# Altium footprint library GCT_USB-C.PcbLib: 27 footprints (part 1 of 2)
Each footprint in its own frame and in the unit in brackets; x right, y up, seen from the top. Pads: shape width x height; smd on the part's side, far side on the other; paste and mask are expansions set on the pad; w line width, h text height; cw(c..) or ccw(c..) is an arc to the next point about the centre after c.
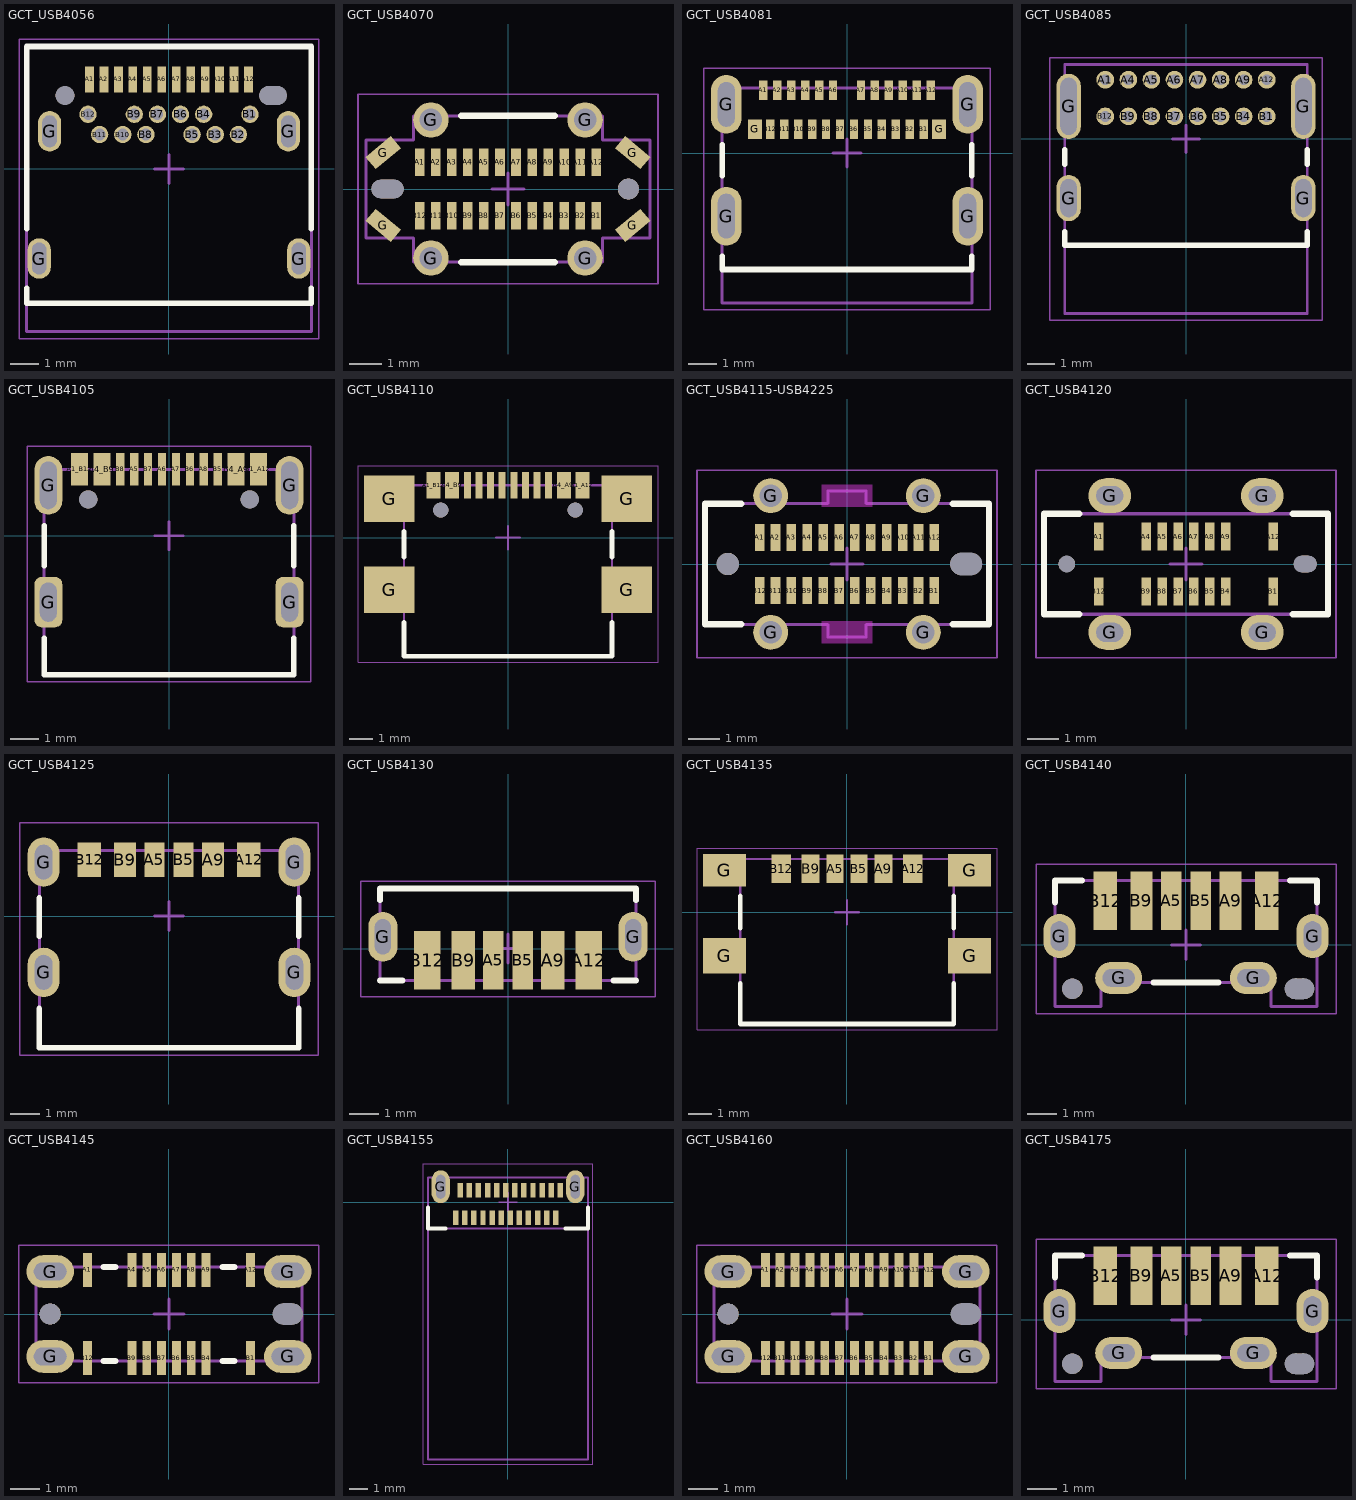
[diagram p0: the footprints below, top view; thin cyan lines are the x and y axes]

## GCT_USB4056 [mm]
height 3.31
pads (30):
  rect 0.3x0.9 smd mask+0.07: A1(-2.75,3.1) A2(-2.25,3.1) A3(-1.75,3.1) A4(-1.25,3.1) A5(-0.75,3.1) A6(-0.25,3.1) A7(0.25,3.1) A8(0.75,3.1) A9(1.25,3.1) A10(1.75,3.1) A11(2.25,3.1) A12(2.75,3.1)
  round 0.6 hole 0.4 mask+0.07: B1(2.8,1.89) B2(2.4,1.19) B3(1.6,1.19) B4(1.2,1.89) B5(0.8,1.19) B6(0.4,1.89) B7(-0.4,1.89) B8(-0.8,1.19) B9(-1.2,1.89) B10(-1.6,1.19) B11(-2.4,1.19) B12(-2.8,1.89)
  oval 0.8x1.4 hole 0.5 slot 1.1 at 90 deg mask+0.07: G(-4.49,-3.1) G(-4.13,1.3) G(4.13,1.3) G(4.49,-3.1)
  round 0.65 hole 0.65 unplated mask+0.07: ""(-3.6,2.54)
  oval 0.95x0.65 hole 0.65 slot 0.95 at 0 deg unplated mask+0.07: ""(3.6,2.54)
Top Overlay:
  lines w0.2: -4.925,-4.13 -4.925,-4.65 4.925,-4.65 4.925,-4.13 ; -4.925,-2.07 -4.925,4.24 4.925,4.24 4.925,-2.07
Top Assembly:
  lines w0.1: -4.925,-4.65 -4.925,4.24 4.925,4.24 4.925,-4.65 -4.925,-4.65
  text ".Designator" at -2.252,-0.226 h1
Top Courtyard:
  lines w0.05: -5.175,-5.88 -5.175,4.49 5.175,4.49 5.175,-5.88 -5.175,-5.88
  lines w0.1: -0.5,0 0.5,0 ; 0,-0.5 0,0.5
Assembly Notes:
  lines w0.1: -4.925,-5.63 4.925,-5.63 4.925,-4.65 -4.925,-4.65 -4.925,-5.63
  text "PCB Edge" at 2.716,-4.468 h0.51
3D body "USB4056-03-A--3DModel-STEP-269445.STEP": height 3.31, standoff -1.15, extent -4.925,-5.629 4.925,4.241

## GCT_USB4070 [mm]
height 10.8
pads (34):
  rect 0.3x0.85 smd mask+0.07: A1(-2.75,0.83) A2(-2.25,0.83) A3(-1.75,0.83) A4(-1.25,0.83) A5(-0.75,0.83) A6(-0.25,0.83) A7(0.25,0.83) A8(0.75,0.83) A9(1.25,0.83) A10(1.75,0.83) A11(2.25,0.83) A12(2.75,0.83) B1(2.75,-0.83) B2(2.25,-0.83) B3(1.75,-0.83) B4(1.25,-0.83) B5(0.75,-0.83) B6(0.25,-0.83) B7(-0.25,-0.83) B8(-0.75,-0.83) B9(-1.25,-0.83) B10(-1.75,-0.83) B11(-2.25,-0.83) B12(-2.75,-0.83)
  rect 1.03x0.5 smd rot 140 mask+0.07: G(-3.88,-1.135) G(3.88,1.135)
  rect 1.03x0.5 smd rot 40 mask+0.07: G(-3.88,1.135) G(3.88,-1.135)
  round 1.1 hole 0.7 mask+0.07: G(-2.4,-2.15) G(-2.4,2.15) G(2.4,-2.15) G(2.4,2.15)
  oval 1x0.58 hole 0.58 slot 1 at 0 deg unplated mask+0.07: ""(-3.75,0)
  round 0.66 hole 0.66 unplated mask+0.07: ""(3.75,0)
Top Overlay:
  lines w0.2: -1.456,-2.275 1.456,-2.275 ; -1.456,2.275 1.456,2.275
Top Assembly:
  lines w0.1: -4.42,-1.53 -4.42,1.53 -2.94,1.53 -2.94,2.275 2.94,2.275 2.94,1.53 4.42,1.53 4.42,-1.53 2.94,-1.53 2.94,-2.275 -2.94,-2.275 -2.94,-1.53 -4.42,-1.53
  text ".Designator" at -2.252,-0.226 h1
Top Courtyard:
  lines w0.05: -4.67,-2.95 4.67,-2.95 4.67,2.95 -4.67,2.95 -4.67,-2.95
  lines w0.1: -0.5,0 0.5,0 ; 0,-0.5 0,0.5
3D body "step_temp.STEP": height 10.8, standoff -1.3, extent -4.42,-2.275 4.42,2.275

## GCT_USB4081 [mm]
height 3.26
pads (30):
  rect 0.3x0.7 smd mask+0.07: A1(-3,2.255) A2(-2.5,2.255) A3(-2,2.255) A4(-1.5,2.255) A5(-1,2.255) A6(-0.5,2.255) A7(0.5,2.255) A8(1,2.255) A9(1.5,2.255) A10(2,2.255) A11(2.5,2.255) A12(3,2.255) B1(2.75,0.855) B2(2.25,0.855) B3(1.75,0.855) B4(1.25,0.855) B5(0.75,0.855) B6(0.25,0.855) B7(-0.25,0.855) B8(-0.75,0.855) B9(-1.25,0.855) B10(-1.75,0.855) B11(-2.25,0.855) B12(-2.75,0.855)
  oval 1.1x2.1 hole 0.6 slot 1.6 at 90 deg mask+0.07: G(-4.32,-2.255) G(-4.32,1.745) G(4.32,-2.255) G(4.32,1.745)
  rect 0.5x0.7 smd mask+0.07: G(-3.3,0.855) G(3.3,0.855)
Top Overlay:
  lines w0.2: -4.47,-3.697 -4.47,-4.167 4.47,-4.167 4.47,-3.697 ; -4.47,-0.813 -4.47,0.303 ; 4.47,-0.813 4.47,0.303
Top Assembly:
  lines w0.1: -4.47,-4.167 4.47,-4.167 4.47,2.335 -4.47,2.335 -4.47,-4.167
  text ".Designator" at -2.252,-0.226 h1
Top Courtyard:
  lines w0.05: -5.12,-5.615 5.12,-5.615 5.12,3.045 -5.12,3.045 -5.12,-5.615
  lines w0.1: -0.5,0 0.5,0 ; 0,-0.5 0,0.5
Assembly Notes:
  lines w0.1: -4.47,-5.365 -4.47,-4.167 4.47,-4.167 4.47,-5.365 -4.47,-5.365
  text "PCB Edge" at 2.266,-3.973 h0.51
3D body "usb4081-03-a.stp": height 3.26, standoff -1.6, extent -4.47,-5.4 4.47,2.405

## GCT_USB4085 [mm]
height 3.16
pads (20):
  round 0.65 hole 0.4 mask+0.07: A1(-2.975,2.18) A4(-2.125,2.18) A5(-1.275,2.18) A6(-0.425,2.18) A7(0.425,2.18) A8(1.275,2.18) A9(2.125,2.18) A12(2.975,2.18) B1(2.975,0.83) B4(2.125,0.83) B5(1.275,0.83) B6(0.425,0.83) B7(-0.425,0.83) B8(-1.275,0.83) B9(-2.125,0.83) B12(-2.975,0.83)
  oval 0.9x1.7 hole 0.6 slot 1.4 at 90 deg mask+0.07: G(-4.325,-2.18) G(4.325,-2.18)
  oval 0.9x2.4 hole 0.6 slot 2.1 at 90 deg mask+0.07: G(-4.325,1.2) G(4.325,1.2)
Top Overlay:
  lines w0.2: -4.47,-3.422 -4.47,-3.92 4.47,-3.92 4.47,-3.422 ; -4.47,-0.938 -4.47,-0.392 ; 4.47,-0.938 4.47,-0.392
Top Assembly:
  lines w0.1: -4.47,-3.92 4.47,-3.92 4.47,2.74 -4.47,2.74 -4.47,-3.92
  text ".Designator" at -2.252,-0.226 h1
Top Courtyard:
  lines w0.05: -5.025,-6.68 5.025,-6.68 5.025,2.99 -5.025,2.99 -5.025,-6.68
  lines w0.1: -0.5,0 0.5,0 ; 0,-0.5 0,0.5
Assembly Notes:
  lines w0.1: -4.47,-6.43 4.47,-6.43 4.47,-3.92 -4.47,-3.92 -4.47,-6.43
  text "PCB Edge" at 2.268,-3.695 h0.51
3D body "step_temp.STEP": height 3.46, standoff -2.1, extent -4.47,-6.43 4.47,2.74

## GCT_USB4105 [mm]
height 3.31
pads (18):
  rect 0.6x1.15 smd mask+0.07: A1_B12(-3.2,2.378) A4_B9(-2.4,2.378) B1_A12(3.2,2.378) B4_A9(2.4,2.378)
  rect 0.3x1.15 smd mask+0.07: A5(-1.25,2.378) A6(-0.25,2.378) A7(0.25,2.378) A8(1.25,2.378) B5(1.75,2.378) B6(0.75,2.378) B7(-0.75,2.378) B8(-1.75,2.378)
  rrect50% 1x1.8 hole 0.6 slot 1.4 at 90 deg mask+0.07: G(-4.32,-2.377) G(4.32,-2.377)
  oval 1x2.1 hole 0.6 slot 1.7 at 90 deg mask+0.07: G(-4.32,1.803) G(4.32,1.803)
  round 0.65 hole 0.65 unplated mask+0.07: ""(-2.89,1.303) ""(2.89,1.303)
Top Overlay:
  lines w0.2: -4.47,-3.677 -4.47,-4.977 4.47,-4.977 4.47,-3.677 ; -4.47,-1.077 -4.47,0.361 ; 4.47,-1.077 4.47,0.361
Top Assembly:
  lines w0.1: -4.47,-4.977 -4.47,2.373 4.47,2.373 4.47,-4.977 -4.47,-4.977
  text ".Designator" at -2.252,-0.226 h1
  text "PCB Edge" at 2.268,-4.781 h0.51
Top Courtyard:
  lines w0.05: -5.07,-5.227 5.07,-5.227 5.07,3.203 -5.07,3.203 -5.07,-5.227
  lines w0.1: -0.5,0 0.5,0 ; 0,-0.5 0,0.5
3D body "step_temp.STEP": height 3.31, standoff -1.1, extent -4.47,-4.977 4.47,2.733

## GCT_USB4110 [mm]
height 3.16
pads (18):
  rect 0.6x1.15 smd mask+0.07: A1_B12(-3.2,2.253) A4_B9(-2.4,2.253) B1_A12(3.2,2.253) B4_A9(2.4,2.253)
  rect 0.3x1.15 smd mask+0.07: A5(-1.25,2.253) A6(-0.25,2.253) A7(0.25,2.253) A8(1.25,2.253) B5(1.75,2.253) B6(0.75,2.253) B7(-0.75,2.253) B8(-1.75,2.253)
  rect 2.18x2 smd mask+0.07: G(-5.11,-2.252) G(-5.11,1.678) G(5.11,-2.252) G(5.11,1.678)
  round 0.65 hole 0.65 unplated mask+0.07: ""(-2.89,1.178) ""(2.89,1.178)
Top Overlay:
  lines w0.2: -4.47,-3.652 -4.47,-5.102 4.47,-5.102 4.47,-3.652 ; -4.47,-0.852 -4.47,0.278 ; 4.47,-0.852 4.47,0.278
Top Assembly:
  lines w0.1: -4.47,-5.102 4.47,-5.102 4.47,2.248 -4.47,2.248 -4.47,-5.102
  text "PCB Edge" at 2.268,-4.909 h0.51
  text ".Designator" at -2.252,-0.226 h1
Top Courtyard:
  lines w0.05: -6.45,-5.352 -6.45,3.078 6.45,3.078 6.45,-5.352 -6.45,-5.352
  lines w0.1: -0.5,0 0.5,0 ; 0,-0.5 0,0.5
3D body "step_temp.STEP": height 3.26, standoff -0.63, extent -5.65,-5.102 5.65,2.598

## GCT_USB4115-USB4225 [mm]
height 10.4
pads (30):
  rect 0.3x0.85 smd mask+0.07: A1(-2.75,0.835) A2(-2.25,0.835) A3(-1.75,0.835) A4(-1.25,0.835) A5(-0.75,0.835) A6(-0.25,0.835) A7(0.25,0.835) A8(0.75,0.835) A9(1.25,0.835) A10(1.75,0.835) A11(2.25,0.835) A12(2.75,0.835) B1(2.75,-0.835) B2(2.25,-0.835) B3(1.75,-0.835) B4(1.25,-0.835) B5(0.75,-0.835) B6(0.25,-0.835) B7(-0.25,-0.835) B8(-0.75,-0.835) B9(-1.25,-0.835) B10(-1.75,-0.835) B11(-2.25,-0.835) B12(-2.75,-0.835)
  round 1.1 hole 0.7 mask+0.07: G(-2.4,-2.15) G(-2.4,2.15) G(2.4,-2.15) G(2.4,2.15)
  round 0.7 hole 0.7 unplated mask+0.07: ""(-3.75,0)
  oval 1x0.7 hole 0.7 slot 1 at 0 deg unplated mask+0.07: ""(3.75,0)
Top Layer keep-out:
  region: 0.8,1.8 -0.8,1.8 -0.8,2.5 0.8,2.5
  region: 0.8,-2.5 -0.8,-2.5 -0.8,-1.8 0.8,-1.8
Top Overlay:
  lines w0.2: -3.328,-1.9 -4.47,-1.9 -4.47,1.9 -3.328,1.9 ; 3.328,-1.9 4.47,-1.9 4.47,1.9 3.328,1.9
Top Assembly:
  lines w0.1: -4.47,-1.9 -0.6,-1.9 -0.6,-2.3 0.6,-2.3 0.6,-1.9 4.47,-1.9 4.47,1.9 0.6,1.9 0.6,2.3 -0.6,2.3 -0.6,1.9 -4.47,1.9 -4.47,-1.9
  text ".Designator" at -2.252,-0.226 h1
Top Courtyard:
  lines w0.05: -4.72,-2.95 -4.72,2.95 4.72,2.95 4.72,-2.95 -4.72,-2.95
  lines w0.1: -0.5,0 0.5,0 ; 0,-0.5 0,0.5
3D body "step_temp.STEP": height 9.3, standoff -1.1, extent -4.47,-2.3 4.47,2.3

## GCT_USB4120 [mm]
height 7.5
pads (22):
  rect 0.3x0.87 smd mask+0.07: A1(-2.75,0.865) A4(-1.25,0.865) A5(-0.75,0.865) A6(-0.25,0.865) A7(0.25,0.865) A8(0.75,0.865) A9(1.25,0.865) A12(2.75,0.865) B1(2.75,-0.865) B4(1.25,-0.865) B5(0.75,-0.865) B6(0.25,-0.865) B7(-0.25,-0.865) B8(-0.75,-0.865) B9(-1.25,-0.865) B12(-2.75,-0.865)
  oval 1.35x1.1 hole 0.6 slot 0.85 at 0 deg mask+0.07: G(-2.4,-2.15) G(-2.4,2.15) G(2.4,-2.15) G(2.4,2.15)
  round 0.52 hole 0.52 unplated mask+0.07: ""(-3.75,0)
  oval 0.72x0.52 hole 0.52 slot 0.72 at 0 deg unplated mask+0.07: ""(3.75,0)
Top Overlay:
  lines w0.2: -3.362,-1.58 -4.47,-1.58 -4.47,1.58 -3.362,1.58 ; 3.362,-1.58 4.47,-1.58 4.47,1.58 3.362,1.58
Top Assembly:
  lines w0.1: -4.47,-1.58 -4.47,1.58 4.47,1.58 4.47,-1.58 -4.47,-1.58
  text ".Designator" at -2.252,-0.226 h1
Top Courtyard:
  lines w0.05: -4.72,-2.95 -4.72,2.95 4.72,2.95 4.72,-2.95 -4.72,-2.95
  lines w0.1: -0.5,0 0.5,0 ; 0,-0.5 0,0.5
3D body "USB4120-03-C--3DModel-STEP-56544.STEP": height 6.5, standoff -0.95, extent -4.47,-2.3 4.47,2.3

## GCT_USB4125 [mm]
height 3.16
pads (10):
  rect 0.7x1.2 smd mask+0.07: A5(-0.5,1.94) B5(0.5,1.94)
  rect 0.76x1.2 smd mask+0.07: A9(1.52,1.94) B9(-1.52,1.94)
  rect 0.8x1.2 smd mask+0.07: A12(2.75,1.94) B12(-2.75,1.94)
  oval 1.1x1.7 hole 0.6 slot 1.2 at 90 deg mask+0.07: G(-4.32,-1.94) G(-4.32,1.86) G(4.32,-1.94) G(4.32,1.86)
Top Overlay:
  lines w0.2: -4.47,-3.182 -4.47,-4.54 4.47,-4.54 4.47,-3.182 ; -4.47,-0.698 -4.47,0.618 ; 4.47,-0.698 4.47,0.618
Top Assembly:
  lines w0.1: -4.47,-4.54 -4.47,2.26 4.47,2.26 4.47,-4.54 -4.47,-4.54
  text ".Designator" at -2.252,-0.226 h1
  text "PCB Edge" at 2.216,-4.258 h0.51
Top Courtyard:
  lines w0.05: -5.15,-4.79 -5.15,3.21 5.15,3.21 5.15,-4.79 -5.15,-4.79
  lines w0.1: -0.5,0 0.5,0 ; 0,-0.5 0,0.5
3D body "USB4125-GF-A--3DModel-STEP-56544.STEP": height 3.26, standoff -1.25, extent -4.47,-4.45 4.47,2.45

## GCT_USB4130 [mm]
height 6.5
pads (8):
  rect 0.7x2 smd mask+0.07: A5(-0.5,-0.4) B5(0.5,-0.4)
  rect 0.8x2 smd mask+0.07: A9(1.52,-0.4) B9(-1.52,-0.4)
  rect 0.9x2 smd mask+0.07: A12(2.75,-0.4) B12(-2.75,-0.4)
  oval 1x1.7 hole 0.55 slot 1.2 at 90 deg mask+0.07: G(-4.27,0.4) G(4.27,0.4)
Top Overlay:
  lines w0.2: -4.37,-1.09 -3.6,-1.09 ; -4.37,1.646 -4.37,2.05 4.37,2.05 4.37,1.646 ; 3.6,-1.09 4.37,-1.09
Top Assembly:
  lines w0.1: -4.37,-1.09 -4.37,2.05 4.37,2.05 4.37,-1.09 -4.37,-1.09
  text ".Designator" at -2.252,-0.226 h1
Top Courtyard:
  lines w0.05: -5.02,-1.65 -5.02,2.3 5.02,2.3 5.02,-1.65 -5.02,-1.65
  lines w0.1: -0.5,0 0.5,0 ; 0,-0.5 0,0.5
3D body "USB4130-GF-C.stp": height 6.5, standoff -1.2, extent -4.385,-1.07 4.355,2.08

## GCT_USB4135 [mm]
height 3.25
pads (10):
  rect 0.7x1.2 smd mask+0.07: A5(-0.5,1.817) B5(0.5,1.817)
  rect 0.76x1.2 smd mask+0.07: A9(1.52,1.817) B9(-1.52,1.817)
  rect 0.8x1.2 smd mask+0.07: A12(2.75,1.817) B12(-2.75,1.817)
  rect 1.8x1.5 smd mask+0.07: G(-5.125,-1.817) G(5.125,-1.817)
  rect 1.8x1.35 smd mask+0.07: G(-5.125,1.763) G(5.125,1.763)
Top Overlay:
  lines w0.2: -4.47,-2.967 -4.47,-4.667 4.47,-4.667 4.47,-2.967 ; -4.47,-0.667 -4.47,0.687 ; 4.47,-0.667 4.47,0.687
Top Assembly:
  lines w0.1: -4.47,-4.667 -4.47,2.232 4.47,2.232 4.47,-4.667 -4.47,-4.667
  text ".Designator" at -2.252,-0.226 h1
  text "PCB Edge" at 2.216,-4.435 h0.51
Top Courtyard:
  lines w0.05: -6.275,-4.917 -6.275,2.688 6.275,2.688 6.275,-4.917 -6.275,-4.917
  lines w0.1: -0.5,0 0.5,0 ; 0,-0.5 0,0.5
3D body "step_temp.STEP": height 3.25, standoff 0, extent -5.57,-4.667 5.569,2.232

## GCT_USB4140 [mm]
height 8.5
pads (12):
  rect 0.7x2 smd mask+0.07: A5(-0.5,1.5) B5(0.5,1.5)
  rect 0.76x2 smd mask+0.07: A9(1.52,1.5) B9(-1.52,1.5)
  rect 0.8x2 smd mask+0.07: A12(2.75,1.5) B12(-2.75,1.5)
  oval 1.1x1.5 hole 0.6 slot 1 at 90 deg mask+0.07: G(-4.32,0.3) G(4.32,0.3)
  oval 1.6x1.1 hole 0.6 slot 1.1 at 0 deg mask+0.07: G(-2.3,-1.13) G(2.3,-1.13)
  round 0.7 hole 0.7 unplated mask+0.07: ""(-3.875,-1.5)
  oval 1x0.7 hole 0.7 slot 1 at 0 deg unplated mask+0.07: ""(3.875,-1.5)
Top Overlay:
  lines w0.2: -4.47,1.442 -4.47,2.2 -3.55,2.2 ; -1.108,-1.28 1.108,-1.28 ; 3.55,2.2 4.47,2.2 4.47,1.442
Top Assembly:
  lines w0: 3.45,-1.5 ccw(c3.775,-1.5) 3.775,-1.825 3.975,-1.825 ccw(c3.975,-1.5) 4.3,-1.5 ccw(c3.975,-1.5) 3.975,-1.175 3.775,-1.175 ccw(c3.775,-1.5) 3.45,-1.5
  lines w0.1: -4.47,-2.1 -2.9,-2.1 -2.9,-1.28 2.9,-1.28 2.9,-2.1 4.47,-2.1 4.47,2.2 -4.47,2.2 -4.47,-2.1
  text ".Designator" at -2.252,-0.226 h1
Top Courtyard:
  lines w0.05: -5.12,-2.35 5.12,-2.35 5.12,2.75 -5.12,2.75 -5.12,-2.35
  lines w0.1: -0.5,0 0.5,0 ; 0,-0.5 0,0.5
3D body "USB4140-GF-0070-C.stp": height 6.5, standoff -0.73, extent -4.47,-2.1 4.47,2.2

## GCT_USB4145 [mm]
height 7.66
pads (22):
  rect 0.3x1.15 smd mask+0.07: A1(-2.75,1.485) A4(-1.25,1.485) A5(-0.75,1.485) A6(-0.25,1.485) A7(0.25,1.485) A8(0.75,1.485) A9(1.25,1.485) A12(2.75,1.485) B1(2.75,-1.485) B4(1.25,-1.485) B5(0.75,-1.485) B6(0.25,-1.485) B7(-0.25,-1.485) B8(-0.75,-1.485) B9(-1.25,-1.485) B12(-2.75,-1.485)
  oval 1.6x1.1 hole 0.6 slot 1.1 at 0 deg mask+0.07: G(-4,-1.43) G(-4,1.43) G(4,-1.43) G(4,1.43)
  round 0.71 hole 0.71 unplated mask+0.07: ""(-4,0)
  oval 1.01x0.71 hole 0.71 slot 1.01 at 0 deg unplated mask+0.07: ""(4,0)
Top Overlay:
  lines w0.2: -2.2,-1.58 -1.8,-1.58 ; -2.2,1.58 -1.8,1.58 ; 1.8,-1.58 2.2,-1.58 ; 1.8,1.58 2.2,1.58
Top Assembly:
  lines w0.1: -4.47,-1.58 -4.47,1.58 4.47,1.58 4.47,-1.58 -4.47,-1.58
  text ".Designator" at -2.252,-0.226 h1
Top Courtyard:
  lines w0.05: -5.05,-2.31 -5.05,2.31 5.05,2.31 5.05,-2.31 -5.05,-2.31
  lines w0.1: -0.5,0 0.5,0 ; 0,-0.5 0,0.5
3D body "usb4145-03-0070-c.stp": height 7.46, standoff -0.7, extent -4.47,-1.855 4.475,1.835

## GCT_USB4155 [mm]
height 2.9
pads (26):
  rect 0.3x0.8 smd mask+0.07: A1(2.875,0.65) A2(2.375,0.65) A3(1.875,0.65) A4(1.375,0.65) A5(0.875,0.65) A6(0.375,0.65) A7(-0.125,0.65) A8(-0.625,0.65) A9(-1.125,0.65) A10(-1.625,0.65) A11(-2.125,0.65) A12(-2.625,0.65) B1(-2.875,-0.85) B2(-2.375,-0.85) B3(-1.875,-0.85) B4(-1.375,-0.85) B5(-0.875,-0.85) B6(-0.375,-0.85) B7(0.125,-0.85) B8(0.625,-0.85) B9(1.125,-0.85) B10(1.625,-0.85) B11(2.125,-0.85) B12(2.625,-0.85)
  oval 1x1.8 hole 0.5 slot 1.3 at 90 deg mask+0.07: G(-3.7,0.85) G(3.7,0.85)
Top Overlay:
  lines w0.2: -4.4,-0.284 -4.4,-1.45 -3.414,-1.45 ; 3.164,-1.45 4.4,-1.45 4.4,-0.284
Top Assembly:
  lines w0.1: -4.4,-1.45 4.4,-1.45 4.4,1.35 -4.4,1.35 -4.4,-1.45
  text ".Designator" at -2.252,-0.226 h1
Top Courtyard:
  lines w0.05: -4.65,-14.4 -4.65,2.1 4.65,2.1 4.65,-14.4 -4.65,-14.4
  lines w0.1: -0.5,0 0.5,0 ; 0,-0.5 0,0.5
Assembly Notes:
  lines w0.1: -4.4,-14.15 -4.4,-1.45 4.4,-1.45 4.4,-14.15 -4.4,-14.15
  text "PCB Edge" at 2.141,-1.234 h0.51
3D body "USB4155-03-C--3DModel-STEP-1.STEP": height 1.58, standoff -1.32, extent -4.4,-14.1 4.4,1.4

## GCT_USB4160 [mm]
height 7.66
pads (30):
  rect 0.3x1.15 smd mask+0.07: A1(-2.75,1.485) A2(-2.25,1.485) A3(-1.75,1.485) A4(-1.25,1.485) A5(-0.75,1.485) A6(-0.25,1.485) A7(0.25,1.485) A8(0.75,1.485) A9(1.25,1.485) A10(1.75,1.485) A11(2.25,1.485) A12(2.75,1.485) B1(2.75,-1.485) B2(2.25,-1.485) B3(1.75,-1.485) B4(1.25,-1.485) B5(0.75,-1.485) B6(0.25,-1.485) B7(-0.25,-1.485) B8(-0.75,-1.485) B9(-1.25,-1.485) B10(-1.75,-1.485) B11(-2.25,-1.485) B12(-2.75,-1.485)
  oval 1.6x1.1 hole 0.6 slot 1.1 at 0 deg mask+0.07: G(-4,-1.43) G(-4,1.43) G(4,-1.43) G(4,1.43)
  round 0.71 hole 0.71 unplated mask+0.07: ""(-4,0)
  oval 1.01x0.71 hole 0.71 slot 1.01 at 0 deg unplated mask+0.07: ""(4,0)
Top Assembly:
  lines w0.1: -4.47,-1.58 4.47,-1.58 4.47,1.58 -4.47,1.58 -4.47,-1.58
  text ".Designator" at -2.252,-0.226 h1
Top Courtyard:
  lines w0.05: -5.05,-2.31 5.05,-2.31 5.05,2.31 -5.05,2.31 -5.05,-2.31
  lines w0.1: -0.5,0 0.5,0 ; 0,-0.5 0,0.5
3D body "usb4160-03-0230-c.stp": height 7.46, standoff -2.3, extent -4.47,-1.855 4.475,1.835

## GCT_USB4175 [mm]
height 13
pads (12):
  rect 0.7x2 smd mask+0.07: A5(-0.5,1.5) B5(0.5,1.5)
  rect 0.76x2 smd mask+0.07: A9(1.52,1.5) B9(-1.52,1.5)
  rect 0.8x2 smd mask+0.07: A12(2.75,1.5) B12(-2.75,1.5)
  oval 1.1x1.5 hole 0.6 slot 1 at 90 deg mask+0.07: G(-4.32,0.3) G(4.32,0.3)
  oval 1.6x1.1 hole 0.6 slot 1.1 at 0 deg mask+0.07: G(-2.3,-1.13) G(2.3,-1.13)
  round 0.7 hole 0.7 unplated mask+0.07: ""(-3.875,-1.5)
  oval 1x0.7 hole 0.7 slot 1 at 0 deg unplated mask+0.07: ""(3.875,-1.5)
Top Overlay:
  lines w0.2: -4.47,1.442 -4.47,2.2 -3.55,2.2 ; -1.108,-1.28 1.108,-1.28 ; 3.55,2.2 4.47,2.2 4.47,1.442
Top Assembly:
  lines w0: 3.45,-1.5 cw(c3.775,-1.5) 3.775,-1.175 3.975,-1.175 cw(c3.975,-1.5) 4.3,-1.5 cw(c3.975,-1.5) 3.975,-1.825 3.775,-1.825 cw(c3.775,-1.5) 3.45,-1.5
  lines w0.1: -4.47,-2.1 -4.47,2.2 4.47,2.2 4.47,-2.1 2.9,-2.1 2.9,-1.28 -2.9,-1.28 -2.9,-2.1 -4.47,-2.1
  text ".Designator" at -2.252,-0.226 h1
Top Courtyard:
  lines w0.05: -5.12,-2.35 -5.12,2.75 5.12,2.75 5.12,-2.35 -5.12,-2.35
  lines w0.1: -0.5,0 0.5,0 ; 0,-0.5 0,0.5
3D body "USB4175-GF-0160-C.stp": height 11, standoff -1.6, extent -4.47,-2.1 4.47,2.2